# Altium schematic symbol library jlcpcb_2025_04_inductors_extended_0402.schlib: 1396 symbols (part 3 of 8)
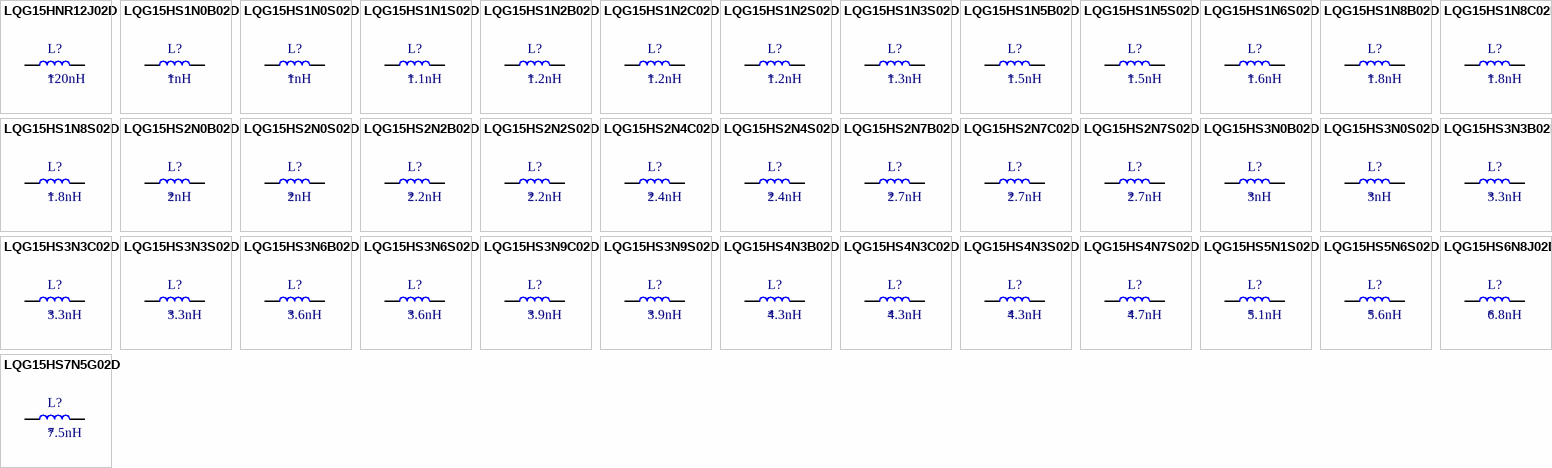
[diagram p36: symbols LQG15HNR12J02D to LQG15HS7N5G02D]

## LQG15HS2N0B02D
designator L?  Inductance: 2nH
Inductor, 2nH, 90mΩ, 900mA, SMD 0402; Manufacturer: Murata Electronics; Manufacturer Part Number: LQG15HS2N0B02D; Package Size: 0402; JLCPCB Basic Part: No; JLCPCB Part Number: C2986275; Supplier 1: LCSC; Category: Inductors; Supplier Part Number 1: C2986275; Rated Current: 900mA; DC Resistance: 90mΩ; RoHS: Yes; ComponentLink1Description: Datasheet; ComponentLink1URL: https://wmsc.lcsc.com/wmsc/upload/file/pdf/v2/lcsc/2206161801_Murata-Electronics-LQG15HS2N0B02D_C2986275.pdf; ComponentLink2Description: JLCPCB Part URL; ComponentLink2URL: https://jlcpcb.com/partdetail/C2986275; ComponentLink3Description: LCSC Part URL; ComponentLink3URL: https://lcsc.com/product-detail/Inductors-SMD_Murata-Electronics-Murata-Electronics-LQG15HS2N0B02D_C2986275.html
footprint IND-0402 (0402 (1005M) Inductor)
pins: 1, 2

## LQG15HS2N0S02D
designator L?  Inductance: 2nH
Inductor, 2nH, 90mΩ, 900mA, SMD 0402; Manufacturer: Murata Electronics; Manufacturer Part Number: LQG15HS2N0S02D; Self-Resonant Frequency: 6GHz; Q Factor: 8@100MHz; Package Size: 0402; JLCPCB Basic Part: No; JLCPCB Part Number: C18216; Supplier 1: LCSC; Category: Inductors; Supplier Part Number 1: C18216; Rated Current: 900mA; DC Resistance: 90mΩ; RoHS: Yes; ComponentLink1Description: Datasheet; ComponentLink1URL: https://wmsc.lcsc.com/wmsc/upload/file/pdf/v2/lcsc/2304140030_Murata-Electronics-LQG15HS2N0S02D_C18216.pdf; ComponentLink2Description: JLCPCB Part URL; ComponentLink2URL: https://jlcpcb.com/partdetail/C18216; ComponentLink3Description: LCSC Part URL; ComponentLink3URL: https://lcsc.com/product-detail/Inductors-SMD_Murata-Electronics-Murata-Electronics-LQG15HS2N0S02D_C18216.html
footprint IND-0402 (0402 (1005M) Inductor)
pins: 1, 2

## LQG15HS2N2B02D
designator L?  Inductance: 2.2nH
Inductor, 2.2nH, 90mΩ, 900mA, SMD 0402; Manufacturer: Murata Electronics; Manufacturer Part Number: LQG15HS2N2B02D; Self-Resonant Frequency: 6GHz; Q Factor: 8@100MHz; Package Size: 0402; JLCPCB Basic Part: No; JLCPCB Part Number: C162540; Supplier 1: LCSC; Category: Inductors; Supplier Part Number 1: C162540; Rated Current: 900mA; DC Resistance: 90mΩ; RoHS: Yes; ComponentLink1Description: Datasheet; ComponentLink1URL: https://wmsc.lcsc.com/wmsc/upload/file/pdf/v2/lcsc/2304140030_Murata-Electronics-LQG15HS2N2B02D_C162540.pdf; ComponentLink2Description: JLCPCB Part URL; ComponentLink2URL: https://jlcpcb.com/partdetail/C162540; ComponentLink3Description: LCSC Part URL; ComponentLink3URL: https://lcsc.com/product-detail/Inductors-SMD_Murata-Electronics-Murata-Electronics-LQG15HS2N2B02D_C162540.html
footprint IND-0402 (0402 (1005M) Inductor)
pins: 1, 2

## LQG15HS2N2S02D
designator L?  Inductance: 2.2nH
Inductor, 2.2nH, 90mΩ, 900mA, SMD 0402; Manufacturer: Murata Electronics; Manufacturer Part Number: LQG15HS2N2S02D; Self-Resonant Frequency: 6GHz; Q Factor: 8@100MHz; Package Size: 0402; JLCPCB Basic Part: No; JLCPCB Part Number: C86061; Supplier 1: LCSC; Category: Inductors; Supplier Part Number 1: C86061; Rated Current: 900mA; DC Resistance: 90mΩ; RoHS: Yes; ComponentLink1Description: Datasheet; ComponentLink1URL: https://wmsc.lcsc.com/wmsc/upload/file/pdf/v2/lcsc/2304140030_Murata-Electronics-LQG15HS2N2S02D_C86061.pdf; ComponentLink2Description: JLCPCB Part URL; ComponentLink2URL: https://jlcpcb.com/partdetail/C86061; ComponentLink3Description: LCSC Part URL; ComponentLink3URL: https://lcsc.com/product-detail/Inductors-SMD_Murata-Electronics-Murata-Electronics-LQG15HS2N2S02D_C86061.html
footprint IND-0402 (0402 (1005M) Inductor)
pins: 1, 2

## LQG15HS2N4C02D
designator L?  Inductance: 2.4nH
Inductor, 2.4nH, 110mΩ, 850mA, SMD 0402; Manufacturer: Murata Electronics; Manufacturer Part Number: LQG15HS2N4C02D; Self-Resonant Frequency: 6GHz; Q Factor: 8@100MHz; Package Size: 0402; JLCPCB Basic Part: No; JLCPCB Part Number: C1330457; Supplier 1: LCSC; Category: Inductors; Supplier Part Number 1: C1330457; Rated Current: 850mA; DC Resistance: 110mΩ; RoHS: Yes; ComponentLink1Description: Datasheet; ComponentLink1URL: https://wmsc.lcsc.com/wmsc/upload/file/pdf/v2/lcsc/2304140030_Murata-Electronics-LQG15HS2N4C02D_C1330457.pdf; ComponentLink2Description: JLCPCB Part URL; ComponentLink2URL: https://jlcpcb.com/partdetail/C1330457; ComponentLink3Description: LCSC Part URL; ComponentLink3URL: https://lcsc.com/product-detail/Inductors-SMD_Murata-Electronics-Murata-Electronics-LQG15HS2N4C02D_C1330457.html
footprint IND-0402 (0402 (1005M) Inductor)
pins: 1, 2

## LQG15HS2N4S02D
designator L?  Inductance: 2.4nH
Inductor, 2.4nH, 110mΩ, 850mA, SMD 0402; Manufacturer: Murata Electronics; Manufacturer Part Number: LQG15HS2N4S02D; Self-Resonant Frequency: 6GHz; Q Factor: 8@100MHz; Package Size: 0402; JLCPCB Basic Part: No; JLCPCB Part Number: C97997; Supplier 1: LCSC; Category: Inductors; Supplier Part Number 1: C97997; Rated Current: 850mA; DC Resistance: 110mΩ; RoHS: Yes; ComponentLink1Description: Datasheet; ComponentLink1URL: https://wmsc.lcsc.com/wmsc/upload/file/pdf/v2/lcsc/1811081514_Murata-Electronics-LQG15HS2N4S02D_C97997.pdf; ComponentLink2Description: JLCPCB Part URL; ComponentLink2URL: https://jlcpcb.com/partdetail/C97997; ComponentLink3Description: LCSC Part URL; ComponentLink3URL: https://lcsc.com/product-detail/Inductors-SMD_Murata-Electronics-Murata-Electronics-LQG15HS2N4S02D_C97997.html
footprint IND-0402 (0402 (1005M) Inductor)
pins: 1, 2

## LQG15HS2N7B02D
designator L?  Inductance: 2.7nH
Inductor, 2.7nH, 120mΩ, 800mA, SMD 0402; Manufacturer: Murata Electronics; Manufacturer Part Number: LQG15HS2N7B02D; Self-Resonant Frequency: 6GHz; Q Factor: 8@100MHz; Package Size: 0402; JLCPCB Basic Part: No; JLCPCB Part Number: C162541; Supplier 1: LCSC; Category: Inductors; Supplier Part Number 1: C162541; Rated Current: 800mA; DC Resistance: 120mΩ; RoHS: Yes; ComponentLink1Description: Datasheet; ComponentLink1URL: https://wmsc.lcsc.com/wmsc/upload/file/pdf/v2/lcsc/2304140030_Murata-Electronics-LQG15HS2N7B02D_C162541.pdf; ComponentLink2Description: JLCPCB Part URL; ComponentLink2URL: https://jlcpcb.com/partdetail/C162541; ComponentLink3Description: LCSC Part URL; ComponentLink3URL: https://lcsc.com/product-detail/Inductors-SMD_Murata-Electronics-Murata-Electronics-LQG15HS2N7B02D_C162541.html
footprint IND-0402 (0402 (1005M) Inductor)
pins: 1, 2

## LQG15HS2N7C02D
designator L?  Inductance: 2.7nH
Inductor, 2.7nH, 120mΩ, 800mA, SMD 0402; Manufacturer: Murata Electronics; Manufacturer Part Number: LQG15HS2N7C02D; Self-Resonant Frequency: 6GHz; Q Factor: 8@100MHz; Package Size: 0402; JLCPCB Basic Part: No; JLCPCB Part Number: C2043511; Supplier 1: LCSC; Category: Inductors; Supplier Part Number 1: C2043511; Rated Current: 800mA; DC Resistance: 120mΩ; RoHS: Yes; ComponentLink1Description: Datasheet; ComponentLink1URL: https://wmsc.lcsc.com/wmsc/upload/file/pdf/v2/lcsc/2304140030_Murata-Electronics-LQG15HS2N7C02D_C2043511.pdf; ComponentLink2Description: JLCPCB Part URL; ComponentLink2URL: https://jlcpcb.com/partdetail/C2043511; ComponentLink3Description: LCSC Part URL; ComponentLink3URL: https://lcsc.com/product-detail/Inductors-SMD_Murata-Electronics-Murata-Electronics-LQG15HS2N7C02D_C2043511.html
footprint IND-0402 (0402 (1005M) Inductor)
pins: 1, 2

## LQG15HS2N7S02D
designator L?  Inductance: 2.7nH
Inductor, 2.7nH, 120mΩ, 800mA, SMD 0402; Manufacturer: Murata Electronics; Manufacturer Part Number: LQG15HS2N7S02D; Self-Resonant Frequency: 6GHz; Q Factor: 8@100MHz; Package Size: 0402; JLCPCB Basic Part: No; JLCPCB Part Number: C77108; Supplier 1: LCSC; Category: Inductors; Supplier Part Number 1: C77108; Rated Current: 800mA; DC Resistance: 120mΩ; RoHS: Yes; ComponentLink1Description: Datasheet; ComponentLink1URL: https://wmsc.lcsc.com/wmsc/upload/file/pdf/v2/lcsc/2304140030_Murata-Electronics-LQG15HS2N7S02D_C77108.pdf; ComponentLink2Description: JLCPCB Part URL; ComponentLink2URL: https://jlcpcb.com/partdetail/C77108; ComponentLink3Description: LCSC Part URL; ComponentLink3URL: https://lcsc.com/product-detail/Inductors-SMD_Murata-Electronics-Murata-Electronics-LQG15HS2N7S02D_C77108.html
footprint IND-0402 (0402 (1005M) Inductor)
pins: 1, 2

## LQG15HS3N0B02D
designator L?  Inductance: 3nH
Inductor, 3nH, 125mΩ, 800mA, SMD 0402; Manufacturer: Murata Electronics; Manufacturer Part Number: LQG15HS3N0B02D; Package Size: 0402; JLCPCB Basic Part: No; JLCPCB Part Number: C3910378; Supplier 1: LCSC; Category: Inductors; Supplier Part Number 1: C3910378; Rated Current: 800mA; DC Resistance: 125mΩ; RoHS: Yes; ComponentLink1Description: Datasheet; ComponentLink1URL: https://wmsc.lcsc.com/wmsc/upload/file/pdf/v2/lcsc/2308111609_Murata-Electronics-LQG15HS3N0B02D_C3910378.pdf; ComponentLink2Description: JLCPCB Part URL; ComponentLink2URL: https://jlcpcb.com/partdetail/C3910378; ComponentLink3Description: LCSC Part URL; ComponentLink3URL: https://lcsc.com/product-detail/Inductors-SMD_Murata-Electronics-Murata-Electronics-LQG15HS3N0B02D_C3910378.html
footprint IND-0402 (0402 (1005M) Inductor)
pins: 1, 2

## LQG15HS3N0S02D
designator L?  Inductance: 3nH
Inductor, 3nH, 125mΩ, 800mA, SMD 0402; Manufacturer: Murata Electronics; Manufacturer Part Number: LQG15HS3N0S02D; Self-Resonant Frequency: 6GHz; Q Factor: 8@100MHz; Package Size: 0402; JLCPCB Basic Part: No; JLCPCB Part Number: C19898; Supplier 1: LCSC; Category: Inductors; Supplier Part Number 1: C19898; Rated Current: 800mA; DC Resistance: 125mΩ; RoHS: Yes; ComponentLink1Description: Datasheet; ComponentLink1URL: https://wmsc.lcsc.com/wmsc/upload/file/pdf/v2/lcsc/2304140030_Murata-Electronics-LQG15HS3N0S02D_C19898.pdf; ComponentLink2Description: JLCPCB Part URL; ComponentLink2URL: https://jlcpcb.com/partdetail/C19898; ComponentLink3Description: LCSC Part URL; ComponentLink3URL: https://lcsc.com/product-detail/Inductors-SMD_Murata-Electronics-Murata-Electronics-LQG15HS3N0S02D_C19898.html
footprint IND-0402 (0402 (1005M) Inductor)
pins: 1, 2

## LQG15HS3N3B02D
designator L?  Inductance: 3.3nH
Inductor, 3.3nH, 125mΩ, 800mA, SMD 0402; Manufacturer: Murata Electronics; Manufacturer Part Number: LQG15HS3N3B02D; Self-Resonant Frequency: 6GHz; Q Factor: 8@100MHz; Package Size: 0402; JLCPCB Basic Part: No; JLCPCB Part Number: C162542; Supplier 1: LCSC; Category: Inductors; Supplier Part Number 1: C162542; Rated Current: 800mA; DC Resistance: 125mΩ; RoHS: Yes; ComponentLink1Description: Datasheet; ComponentLink1URL: https://wmsc.lcsc.com/wmsc/upload/file/pdf/v2/lcsc/2304140030_Murata-Electronics-LQG15HS3N3B02D_C162542.pdf; ComponentLink2Description: JLCPCB Part URL; ComponentLink2URL: https://jlcpcb.com/partdetail/C162542; ComponentLink3Description: LCSC Part URL; ComponentLink3URL: https://lcsc.com/product-detail/Inductors-SMD_Murata-Electronics-Murata-Electronics-LQG15HS3N3B02D_C162542.html
footprint IND-0402 (0402 (1005M) Inductor)
pins: 1, 2

## LQG15HS3N3C02D
designator L?  Inductance: 3.3nH
Inductor, 3.3nH, 125mΩ, 800mA, SMD 0402; Manufacturer: Murata Electronics; Manufacturer Part Number: LQG15HS3N3C02D; Self-Resonant Frequency: 6GHz; Q Factor: 8@100MHz; Package Size: 0402; JLCPCB Basic Part: No; JLCPCB Part Number: C516799; Supplier 1: LCSC; Category: Inductors; Supplier Part Number 1: C516799; Rated Current: 800mA; DC Resistance: 125mΩ; RoHS: Yes; ComponentLink1Description: Datasheet; ComponentLink1URL: https://wmsc.lcsc.com/wmsc/upload/file/pdf/v2/lcsc/2304140030_Murata-Electronics-LQG15HS3N3C02D_C516799.pdf; ComponentLink2Description: JLCPCB Part URL; ComponentLink2URL: https://jlcpcb.com/partdetail/C516799; ComponentLink3Description: LCSC Part URL; ComponentLink3URL: https://lcsc.com/product-detail/Inductors-SMD_Murata-Electronics-Murata-Electronics-LQG15HS3N3C02D_C516799.html
footprint IND-0402 (0402 (1005M) Inductor)
pins: 1, 2

## LQG15HS3N3S02D
designator L?  Inductance: 3.3nH
Inductor, 3.3nH, 125mΩ, 800mA, SMD 0402; Manufacturer: Murata Electronics; Manufacturer Part Number: LQG15HS3N3S02D; Self-Resonant Frequency: 6GHz; Q Factor: 8@100MHz; Package Size: 0402; JLCPCB Basic Part: No; JLCPCB Part Number: C86064; Supplier 1: LCSC; Category: Inductors; Supplier Part Number 1: C86064; Rated Current: 800mA; DC Resistance: 125mΩ; RoHS: Yes; ComponentLink1Description: Datasheet; ComponentLink1URL: https://wmsc.lcsc.com/wmsc/upload/file/pdf/v2/lcsc/1811081614_Murata-Electronics-LQG15HS3N3S02D_C86064.pdf; ComponentLink2Description: JLCPCB Part URL; ComponentLink2URL: https://jlcpcb.com/partdetail/C86064; ComponentLink3Description: LCSC Part URL; ComponentLink3URL: https://lcsc.com/product-detail/Inductors-SMD_Murata-Electronics-Murata-Electronics-LQG15HS3N3S02D_C86064.html
footprint IND-0402 (0402 (1005M) Inductor)
pins: 1, 2

## LQG15HS3N6B02D
designator L?  Inductance: 3.6nH
Inductor, 3.6nH, 140mΩ, 750mA, SMD 0402; Manufacturer: Murata Electronics; Manufacturer Part Number: LQG15HS3N6B02D; Self-Resonant Frequency: 6GHz; Q Factor: 8@100MHz; Package Size: 0402; JLCPCB Basic Part: No; JLCPCB Part Number: C237532; Supplier 1: LCSC; Category: Inductors; Supplier Part Number 1: C237532; Rated Current: 750mA; DC Resistance: 140mΩ; RoHS: Yes; ComponentLink1Description: Datasheet; ComponentLink1URL: https://wmsc.lcsc.com/wmsc/upload/file/pdf/v2/lcsc/2304140030_Murata-Electronics-LQG15HS3N6B02D_C237532.pdf; ComponentLink2Description: JLCPCB Part URL; ComponentLink2URL: https://jlcpcb.com/partdetail/C237532; ComponentLink3Description: LCSC Part URL; ComponentLink3URL: https://lcsc.com/product-detail/Inductors-SMD_Murata-Electronics-Murata-Electronics-LQG15HS3N6B02D_C237532.html
footprint IND-0402 (0402 (1005M) Inductor)
pins: 1, 2

## LQG15HS3N6S02D
designator L?  Inductance: 3.6nH
Inductor, 3.6nH, 140mΩ, 750mA, SMD 0402; Manufacturer: Murata Electronics; Manufacturer Part Number: LQG15HS3N6S02D; Self-Resonant Frequency: 6GHz; Q Factor: 8@100MHz; Package Size: 0402; JLCPCB Basic Part: No; JLCPCB Part Number: C19216; Supplier 1: LCSC; Category: Inductors; Supplier Part Number 1: C19216; Rated Current: 750mA; DC Resistance: 140mΩ; RoHS: Yes; ComponentLink1Description: Datasheet; ComponentLink1URL: https://wmsc.lcsc.com/wmsc/upload/file/pdf/v2/lcsc/2304140030_Murata-Electronics-LQG15HS3N6S02D_C19216.pdf; ComponentLink2Description: JLCPCB Part URL; ComponentLink2URL: https://jlcpcb.com/partdetail/C19216; ComponentLink3Description: LCSC Part URL; ComponentLink3URL: https://lcsc.com/product-detail/Inductors-SMD_Murata-Electronics-Murata-Electronics-LQG15HS3N6S02D_C19216.html
footprint IND-0402 (0402 (1005M) Inductor)
pins: 1, 2

## LQG15HS3N9C02D
designator L?  Inductance: 3.9nH
Inductor, 3.9nH, 140mΩ, 750mA, SMD 0402; Manufacturer: Murata Electronics; Manufacturer Part Number: LQG15HS3N9C02D; Self-Resonant Frequency: 6GHz; Q Factor: 8@100MHz; Package Size: 0402; JLCPCB Basic Part: No; JLCPCB Part Number: C560064; Supplier 1: LCSC; Category: Inductors; Supplier Part Number 1: C560064; Rated Current: 750mA; DC Resistance: 140mΩ; RoHS: Yes; ComponentLink1Description: Datasheet; ComponentLink1URL: https://wmsc.lcsc.com/wmsc/upload/file/pdf/v2/lcsc/2304140030_Murata-Electronics-LQG15HS3N9C02D_C560064.pdf; ComponentLink2Description: JLCPCB Part URL; ComponentLink2URL: https://jlcpcb.com/partdetail/C560064; ComponentLink3Description: LCSC Part URL; ComponentLink3URL: https://lcsc.com/product-detail/Inductors-SMD_Murata-Electronics-Murata-Electronics-LQG15HS3N9C02D_C560064.html
footprint IND-0402 (0402 (1005M) Inductor)
pins: 1, 2

## LQG15HS3N9S02D
designator L?  Inductance: 3.9nH
Inductor, 3.9nH, 140mΩ, 750mA, SMD 0402; Manufacturer: Murata Electronics; Manufacturer Part Number: LQG15HS3N9S02D; Self-Resonant Frequency: 6GHz; Q Factor: 8@100MHz; Package Size: 0402; JLCPCB Basic Part: No; JLCPCB Part Number: C77109; Supplier 1: LCSC; Category: Inductors; Supplier Part Number 1: C77109; Rated Current: 750mA; DC Resistance: 140mΩ; RoHS: Yes; ComponentLink1Description: Datasheet; ComponentLink1URL: https://wmsc.lcsc.com/wmsc/upload/file/pdf/v2/lcsc/2304140030_Murata-Electronics-LQG15HS3N9S02D_C77109.pdf; ComponentLink2Description: JLCPCB Part URL; ComponentLink2URL: https://jlcpcb.com/partdetail/C77109; ComponentLink3Description: LCSC Part URL; ComponentLink3URL: https://lcsc.com/product-detail/Inductors-SMD_Murata-Electronics-Murata-Electronics-LQG15HS3N9S02D_C77109.html
footprint IND-0402 (0402 (1005M) Inductor)
pins: 1, 2

## LQG15HS4N3B02D
designator L?  Inductance: 4.3nH
Inductor, 4.3nH, 140mΩ, 750mA, SMD 0402; Manufacturer: Murata Electronics; Manufacturer Part Number: LQG15HS4N3B02D; Self-Resonant Frequency: 6GHz; Q Factor: 8@100MHz; Package Size: 0402; JLCPCB Basic Part: No; JLCPCB Part Number: C668382; Supplier 1: LCSC; Category: Inductors; Supplier Part Number 1: C668382; Rated Current: 750mA; DC Resistance: 140mΩ; RoHS: Yes; ComponentLink1Description: Datasheet; ComponentLink1URL: https://wmsc.lcsc.com/wmsc/upload/file/pdf/v2/lcsc/2304140030_Murata-Electronics-LQG15HS4N3B02D_C668382.pdf; ComponentLink2Description: JLCPCB Part URL; ComponentLink2URL: https://jlcpcb.com/partdetail/C668382; ComponentLink3Description: LCSC Part URL; ComponentLink3URL: https://lcsc.com/product-detail/Inductors-SMD_Murata-Electronics-Murata-Electronics-LQG15HS4N3B02D_C668382.html
footprint IND-0402 (0402 (1005M) Inductor)
pins: 1, 2

## LQG15HS4N3C02D
designator L?  Inductance: 4.3nH
Inductor, 4.3nH, 140mΩ, 750mA, SMD 0402; Manufacturer: Murata Electronics; Manufacturer Part Number: LQG15HS4N3C02D; Self-Resonant Frequency: 6GHz; Q Factor: 8@100MHz; Package Size: 0402; JLCPCB Basic Part: No; JLCPCB Part Number: C1330729; Supplier 1: LCSC; Category: Inductors; Supplier Part Number 1: C1330729; Rated Current: 750mA; DC Resistance: 140mΩ; RoHS: Yes; ComponentLink1Description: Datasheet; ComponentLink1URL: https://wmsc.lcsc.com/wmsc/upload/file/pdf/v2/lcsc/2304140030_Murata-Electronics-LQG15HS4N3C02D_C1330729.pdf; ComponentLink2Description: JLCPCB Part URL; ComponentLink2URL: https://jlcpcb.com/partdetail/C1330729; ComponentLink3Description: LCSC Part URL; ComponentLink3URL: https://lcsc.com/product-detail/Inductors-SMD_Murata-Electronics-Murata-Electronics-LQG15HS4N3C02D_C1330729.html
footprint IND-0402 (0402 (1005M) Inductor)
pins: 1, 2

## LQG15HS4N3S02D
designator L?  Inductance: 4.3nH
Inductor, 4.3nH, 140mΩ, 750mA, SMD 0402; Manufacturer: Murata Electronics; Manufacturer Part Number: LQG15HS4N3S02D; Self-Resonant Frequency: 6GHz; Q Factor: 8@100MHz; Package Size: 0402; JLCPCB Basic Part: No; JLCPCB Part Number: C97999; Supplier 1: LCSC; Category: Inductors; Supplier Part Number 1: C97999; Rated Current: 750mA; DC Resistance: 140mΩ; RoHS: Yes; ComponentLink1Description: Datasheet; ComponentLink1URL: https://wmsc.lcsc.com/wmsc/upload/file/pdf/v2/lcsc/2304140030_Murata-Electronics-LQG15HS4N3S02D_C97999.pdf; ComponentLink2Description: JLCPCB Part URL; ComponentLink2URL: https://jlcpcb.com/partdetail/C97999; ComponentLink3Description: LCSC Part URL; ComponentLink3URL: https://lcsc.com/product-detail/Inductors-SMD_Murata-Electronics-Murata-Electronics-LQG15HS4N3S02D_C97999.html
footprint IND-0402 (0402 (1005M) Inductor)
pins: 1, 2

## LQG15HS4N7S02D
designator L?  Inductance: 4.7nH
Inductor, 4.7nH, 160mΩ, 700mA, SMD 0402; Manufacturer: Murata Electronics; Manufacturer Part Number: LQG15HS4N7S02D; Self-Resonant Frequency: 6GHz; Q Factor: 8@100MHz; Package Size: 0402; JLCPCB Basic Part: No; JLCPCB Part Number: C86065; Supplier 1: LCSC; Category: Inductors; Supplier Part Number 1: C86065; Rated Current: 700mA; DC Resistance: 160mΩ; RoHS: Yes; ComponentLink1Description: Datasheet; ComponentLink1URL: https://wmsc.lcsc.com/wmsc/upload/file/pdf/v2/lcsc/1811081614_Murata-Electronics-LQG15HS4N7S02D_C86065.pdf; ComponentLink2Description: JLCPCB Part URL; ComponentLink2URL: https://jlcpcb.com/partdetail/C86065; ComponentLink3Description: LCSC Part URL; ComponentLink3URL: https://lcsc.com/product-detail/Inductors-SMD_Murata-Electronics-Murata-Electronics-LQG15HS4N7S02D_C86065.html
footprint IND-0402 (0402 (1005M) Inductor)
pins: 1, 2

## LQG15HS5N1S02D
designator L?  Inductance: 5.1nH
Inductor, 5.1nH, 180mΩ, 650mA, SMD 0402; Manufacturer: Murata Electronics; Manufacturer Part Number: LQG15HS5N1S02D; Self-Resonant Frequency: 5.3GHz; Q Factor: 8@100MHz; Package Size: 0402; JLCPCB Basic Part: No; JLCPCB Part Number: C86066; Supplier 1: LCSC; Category: Inductors; Supplier Part Number 1: C86066; Rated Current: 650mA; DC Resistance: 180mΩ; RoHS: Yes; ComponentLink1Description: Datasheet; ComponentLink1URL: https://wmsc.lcsc.com/wmsc/upload/file/pdf/v2/lcsc/1811081616_Murata-Electronics-LQG15HS5N1S02D_C86066.pdf; ComponentLink2Description: JLCPCB Part URL; ComponentLink2URL: https://jlcpcb.com/partdetail/C86066; ComponentLink3Description: LCSC Part URL; ComponentLink3URL: https://lcsc.com/product-detail/Inductors-SMD_Murata-Electronics-Murata-Electronics-LQG15HS5N1S02D_C86066.html
footprint IND-0402 (0402 (1005M) Inductor)
pins: 1, 2

## LQG15HS5N6S02D
designator L?  Inductance: 5.6nH
Inductor, 5.6nH, 180mΩ, 650mA, SMD 0402; Manufacturer: Murata Electronics; Manufacturer Part Number: LQG15HS5N6S02D; Self-Resonant Frequency: 4.5GHz; Q Factor: 8@100MHz; Package Size: 0402; JLCPCB Basic Part: No; JLCPCB Part Number: C85670; Supplier 1: LCSC; Category: Inductors; Supplier Part Number 1: C85670; Rated Current: 650mA; DC Resistance: 180mΩ; RoHS: Yes; ComponentLink1Description: Datasheet; ComponentLink1URL: https://wmsc.lcsc.com/wmsc/upload/file/pdf/v2/lcsc/2304140030_Murata-Electronics-LQG15HS5N6S02D_C85670.pdf; ComponentLink2Description: JLCPCB Part URL; ComponentLink2URL: https://jlcpcb.com/partdetail/C85670; ComponentLink3Description: LCSC Part URL; ComponentLink3URL: https://lcsc.com/product-detail/Inductors-SMD_Murata-Electronics-Murata-Electronics-LQG15HS5N6S02D_C85670.html
footprint IND-0402 (0402 (1005M) Inductor)
pins: 1, 2

## LQG15HS6N8J02D
designator L?  Inductance: 6.8nH
Inductor, 6.8nH, ±5%, 220mΩ, 600mA, SMD 0402; Manufacturer: Murata Electronics; Manufacturer Part Number: LQG15HS6N8J02D; Self-Resonant Frequency: 4.5GHz; Q Factor: 8@100MHz; Package Size: 0402; JLCPCB Basic Part: No; JLCPCB Part Number: C77110; Supplier 1: LCSC; Category: Inductors; Supplier Part Number 1: C77110; Tolerance: ±5%; Rated Current: 600mA; DC Resistance: 220mΩ; RoHS: Yes; ComponentLink1Description: Datasheet; ComponentLink1URL: https://wmsc.lcsc.com/wmsc/upload/file/pdf/v2/lcsc/2304140030_Murata-Electronics-LQG15HS6N8J02D_C77110.pdf; ComponentLink2Description: JLCPCB Part URL; ComponentLink2URL: https://jlcpcb.com/partdetail/C77110; ComponentLink3Description: LCSC Part URL; ComponentLink3URL: https://lcsc.com/product-detail/Inductors-SMD_Murata-Electronics-Murata-Electronics-LQG15HS6N8J02D_C77110.html
footprint IND-0402 (0402 (1005M) Inductor)
pins: 1, 2

## LQG15HS7N5G02D
designator L?  Inductance: 7.5nH
Inductor, 7.5nH, ±2%, 240mΩ, 550mA, SMD 0402; Manufacturer: Murata Electronics; Manufacturer Part Number: LQG15HS7N5G02D; Package Size: 0402; JLCPCB Basic Part: No; JLCPCB Part Number: C3911343; Supplier 1: LCSC; Category: Inductors; Supplier Part Number 1: C3911343; Tolerance: ±2%; Rated Current: 550mA; DC Resistance: 240mΩ; RoHS: Yes; ComponentLink1Description: Datasheet; ComponentLink1URL: https://wmsc.lcsc.com/wmsc/upload/file/pdf/v2/lcsc/2308111610_Murata-Electronics-LQG15HS7N5G02D_C3911343.pdf; ComponentLink2Description: JLCPCB Part URL; ComponentLink2URL: https://jlcpcb.com/partdetail/C3911343; ComponentLink3Description: LCSC Part URL; ComponentLink3URL: https://lcsc.com/product-detail/Inductors-SMD_Murata-Electronics-Murata-Electronics-LQG15HS7N5G02D_C3911343.html
footprint IND-0402 (0402 (1005M) Inductor)
pins: 1, 2

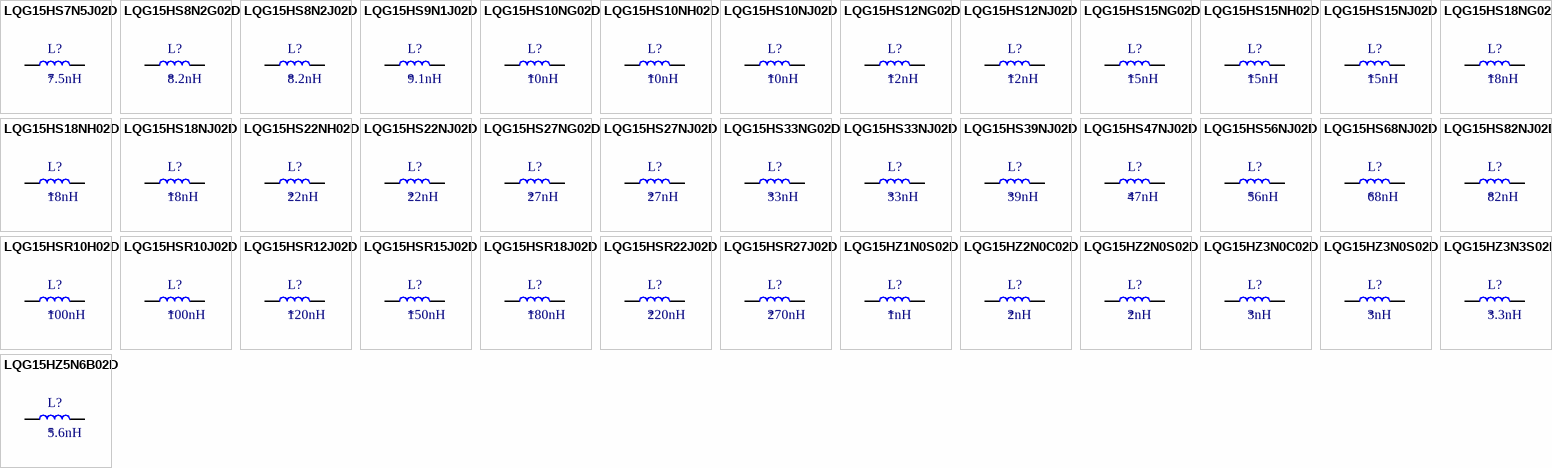
[diagram p10: symbols LQG15HS7N5J02D to LQG15HZ5N6B02D]

## LQG15HS7N5J02D
designator L?  Inductance: 7.5nH
Inductor, 7.5nH, ±5%, 240mΩ, 550mA, SMD 0402; Manufacturer: Murata Electronics; Manufacturer Part Number: LQG15HS7N5J02D; Self-Resonant Frequency: 4.2GHz; Q Factor: 8@100MHz; Package Size: 0402; JLCPCB Basic Part: No; JLCPCB Part Number: C98001; Supplier 1: LCSC; Category: Inductors; Supplier Part Number 1: C98001; Tolerance: ±5%; Rated Current: 550mA; DC Resistance: 240mΩ; RoHS: Yes; ComponentLink1Description: Datasheet; ComponentLink1URL: https://wmsc.lcsc.com/wmsc/upload/file/pdf/v2/lcsc/1811081532_Murata-Electronics-LQG15HS7N5J02D_C98001.pdf; ComponentLink2Description: JLCPCB Part URL; ComponentLink2URL: https://jlcpcb.com/partdetail/C98001; ComponentLink3Description: LCSC Part URL; ComponentLink3URL: https://lcsc.com/product-detail/Inductors-SMD_Murata-Electronics-Murata-Electronics-LQG15HS7N5J02D_C98001.html
footprint IND-0402 (0402 (1005M) Inductor)
pins: 1, 2

## LQG15HS8N2G02D
designator L?  Inductance: 8.2nH
Inductor, 8.2nH, ±2%, 240mΩ, 550mA, SMD 0402; Manufacturer: Murata Electronics; Manufacturer Part Number: LQG15HS8N2G02D; Package Size: 0402; JLCPCB Basic Part: No; JLCPCB Part Number: C3910635; Supplier 1: LCSC; Category: Inductors; Supplier Part Number 1: C3910635; Tolerance: ±2%; Rated Current: 550mA; DC Resistance: 240mΩ; RoHS: Yes; ComponentLink1Description: Datasheet; ComponentLink1URL: https://wmsc.lcsc.com/wmsc/upload/file/pdf/v2/lcsc/2308111609_Murata-Electronics-LQG15HS8N2G02D_C3910635.pdf; ComponentLink2Description: JLCPCB Part URL; ComponentLink2URL: https://jlcpcb.com/partdetail/C3910635; ComponentLink3Description: LCSC Part URL; ComponentLink3URL: https://lcsc.com/product-detail/Inductors-SMD_Murata-Electronics-Murata-Electronics-LQG15HS8N2G02D_C3910635.html
footprint IND-0402 (0402 (1005M) Inductor)
pins: 1, 2

## LQG15HS8N2J02D
designator L?  Inductance: 8.2nH
Inductor, 8.2nH, ±5%, 240mΩ, 550mA, SMD 0402; Manufacturer: Murata Electronics; Manufacturer Part Number: LQG15HS8N2J02D; Self-Resonant Frequency: 3.7GHz; Q Factor: 8@100MHz; Package Size: 0402; JLCPCB Basic Part: No; JLCPCB Part Number: C98003; Supplier 1: LCSC; Category: Inductors; Supplier Part Number 1: C98003; Tolerance: ±5%; Rated Current: 550mA; DC Resistance: 240mΩ; RoHS: Yes; ComponentLink1Description: Datasheet; ComponentLink1URL: https://wmsc.lcsc.com/wmsc/upload/file/pdf/v2/lcsc/1811081611_Murata-Electronics-LQG15HS8N2J02D_C98003.pdf; ComponentLink2Description: JLCPCB Part URL; ComponentLink2URL: https://jlcpcb.com/partdetail/C98003; ComponentLink3Description: LCSC Part URL; ComponentLink3URL: https://lcsc.com/product-detail/Inductors-SMD_Murata-Electronics-Murata-Electronics-LQG15HS8N2J02D_C98003.html
footprint IND-0402 (0402 (1005M) Inductor)
pins: 1, 2

## LQG15HS9N1J02D
designator L?  Inductance: 9.1nH
Inductor, 9.1nH, ±5%, 260mΩ, 500mA, SMD 0402; Manufacturer: Murata Electronics; Manufacturer Part Number: LQG15HS9N1J02D; Self-Resonant Frequency: 3.4GHz; Q Factor: 8@100MHz; Package Size: 0402; JLCPCB Basic Part: No; JLCPCB Part Number: C162547; Supplier 1: LCSC; Category: Inductors; Supplier Part Number 1: C162547; Tolerance: ±5%; Rated Current: 500mA; DC Resistance: 260mΩ; RoHS: Yes; ComponentLink1Description: Datasheet; ComponentLink1URL: https://wmsc.lcsc.com/wmsc/upload/file/pdf/v2/lcsc/2304140030_Murata-Electronics-LQG15HS9N1J02D_C162547.pdf; ComponentLink2Description: JLCPCB Part URL; ComponentLink2URL: https://jlcpcb.com/partdetail/C162547; ComponentLink3Description: LCSC Part URL; ComponentLink3URL: https://lcsc.com/product-detail/Inductors-SMD_Murata-Electronics-Murata-Electronics-LQG15HS9N1J02D_C162547.html
footprint IND-0402 (0402 (1005M) Inductor)
pins: 1, 2

## LQG15HS10NG02D
designator L?  Inductance: 10nH
Inductor, 10nH, ±2%, 260mΩ, 500mA, SMD 0402; Manufacturer: Murata Electronics; Manufacturer Part Number: LQG15HS10NG02D; Self-Resonant Frequency: 3.4GHz; Q Factor: 8@100MHz; Package Size: 0402; JLCPCB Basic Part: No; JLCPCB Part Number: C464435; Supplier 1: LCSC; Category: Inductors; Supplier Part Number 1: C464435; Tolerance: ±2%; Rated Current: 500mA; DC Resistance: 260mΩ; RoHS: Yes; ComponentLink1Description: Datasheet; ComponentLink1URL: https://wmsc.lcsc.com/wmsc/upload/file/pdf/v2/lcsc/1912111437_Murata-Electronics-LQG15HS10NG02D_C464435.pdf; ComponentLink2Description: JLCPCB Part URL; ComponentLink2URL: https://jlcpcb.com/partdetail/C464435; ComponentLink3Description: LCSC Part URL; ComponentLink3URL: https://lcsc.com/product-detail/Inductors-SMD_Murata-Electronics-Murata-Electronics-LQG15HS10NG02D_C464435.html
footprint IND-0402 (0402 (1005M) Inductor)
pins: 1, 2

## LQG15HS10NH02D
designator L?  Inductance: 10nH
Inductor, 10nH, ±3%, 260mΩ, 500mA, SMD 0402; Manufacturer: Murata Electronics; Manufacturer Part Number: LQG15HS10NH02D; Self-Resonant Frequency: 3.4GHz; Q Factor: 8@100MHz; Package Size: 0402; JLCPCB Basic Part: No; JLCPCB Part Number: C576525; Supplier 1: LCSC; Category: Inductors; Supplier Part Number 1: C576525; Tolerance: ±3%; Rated Current: 500mA; DC Resistance: 260mΩ; RoHS: Yes; ComponentLink1Description: Datasheet; ComponentLink1URL: https://wmsc.lcsc.com/wmsc/upload/file/pdf/v2/lcsc/2105241311_Murata-Electronics-LQG15HS10NH02D_C576525.pdf; ComponentLink2Description: JLCPCB Part URL; ComponentLink2URL: https://jlcpcb.com/partdetail/C576525; ComponentLink3Description: LCSC Part URL; ComponentLink3URL: https://lcsc.com/product-detail/Inductors-SMD_Murata-Electronics-Murata-Electronics-LQG15HS10NH02D_C576525.html
footprint IND-0402 (0402 (1005M) Inductor)
pins: 1, 2

## LQG15HS10NJ02D
designator L?  Inductance: 10nH
Inductor, 10nH, ±5%, 260mΩ, 500mA, SMD 0402; Manufacturer: Murata Electronics; Manufacturer Part Number: LQG15HS10NJ02D; Self-Resonant Frequency: 3.4GHz; Q Factor: 8@100MHz; Package Size: 0402; JLCPCB Basic Part: No; JLCPCB Part Number: C77103; Supplier 1: LCSC; Category: Inductors; Supplier Part Number 1: C77103; Tolerance: ±5%; Rated Current: 500mA; DC Resistance: 260mΩ; RoHS: Yes; ComponentLink1Description: Datasheet; ComponentLink1URL: https://wmsc.lcsc.com/wmsc/upload/file/pdf/v2/lcsc/2304140030_Murata-Electronics-LQG15HS10NJ02D_C77103.pdf; ComponentLink2Description: JLCPCB Part URL; ComponentLink2URL: https://jlcpcb.com/partdetail/C77103; ComponentLink3Description: LCSC Part URL; ComponentLink3URL: https://lcsc.com/product-detail/Inductors-SMD_Murata-Electronics-Murata-Electronics-LQG15HS10NJ02D_C77103.html
footprint IND-0402 (0402 (1005M) Inductor)
pins: 1, 2

## LQG15HS12NG02D
designator L?  Inductance: 12nH
Inductor, 12nH, ±2%, 280mΩ, SMD 0402; Manufacturer: Murata Electronics; Manufacturer Part Number: LQG15HS12NG02D; Self-Resonant Frequency: 3GHz; Q Factor: 8@100MHz; Package Size: 0402; JLCPCB Basic Part: No; JLCPCB Part Number: C907987; Supplier 1: LCSC; Category: Inductors; Supplier Part Number 1: C907987; Tolerance: ±2%; DC Resistance: 280mΩ; RoHS: Yes; ComponentLink1Description: Datasheet; ComponentLink1URL: https://wmsc.lcsc.com/wmsc/upload/file/pdf/v2/lcsc/2201242100_Murata-Electronics-LQG15HS12NG02D_C907987.pdf; ComponentLink2Description: JLCPCB Part URL; ComponentLink2URL: https://jlcpcb.com/partdetail/C907987; ComponentLink3Description: LCSC Part URL; ComponentLink3URL: https://lcsc.com/product-detail/Inductors-SMD_Murata-Electronics-Murata-Electronics-LQG15HS12NG02D_C907987.html
footprint IND-0402 (0402 (1005M) Inductor)
pins: 1, 2

## LQG15HS12NJ02D
designator L?  Inductance: 12nH
Inductor, 12nH, ±5%, 280mΩ, 500mA, SMD 0402; Manufacturer: Murata Electronics; Manufacturer Part Number: LQG15HS12NJ02D; Self-Resonant Frequency: 3GHz; Q Factor: 8@100MHz; Package Size: 0402; JLCPCB Basic Part: No; JLCPCB Part Number: C77104; Supplier 1: LCSC; Category: Inductors; Supplier Part Number 1: C77104; Tolerance: ±5%; Rated Current: 500mA; DC Resistance: 280mΩ; RoHS: Yes; ComponentLink1Description: Datasheet; ComponentLink1URL: https://wmsc.lcsc.com/wmsc/upload/file/pdf/v2/lcsc/2304140030_Murata-Electronics-LQG15HS12NJ02D_C77104.pdf; ComponentLink2Description: JLCPCB Part URL; ComponentLink2URL: https://jlcpcb.com/partdetail/C77104; ComponentLink3Description: LCSC Part URL; ComponentLink3URL: https://lcsc.com/product-detail/Inductors-SMD_Murata-Electronics-Murata-Electronics-LQG15HS12NJ02D_C77104.html
footprint IND-0402 (0402 (1005M) Inductor)
pins: 1, 2

## LQG15HS15NG02D
designator L?  Inductance: 15nH
Inductor, 15nH, ±2%, 320mΩ, 450mA, SMD 0402; Manufacturer: Murata Electronics; Manufacturer Part Number: LQG15HS15NG02D; Self-Resonant Frequency: 2.5GHz; Q Factor: 8@100MHz; Package Size: 0402; JLCPCB Basic Part: No; JLCPCB Part Number: C576527; Supplier 1: LCSC; Category: Inductors; Supplier Part Number 1: C576527; Tolerance: ±2%; Rated Current: 450mA; DC Resistance: 320mΩ; RoHS: Yes; ComponentLink1Description: Datasheet; ComponentLink1URL: https://wmsc.lcsc.com/wmsc/upload/file/pdf/v2/lcsc/2308111510_Murata-Electronics-LQG15HS15NG02D_C576527.pdf; ComponentLink2Description: JLCPCB Part URL; ComponentLink2URL: https://jlcpcb.com/partdetail/C576527; ComponentLink3Description: LCSC Part URL; ComponentLink3URL: https://lcsc.com/product-detail/Inductors-SMD_Murata-Electronics-Murata-Electronics-LQG15HS15NG02D_C576527.html
footprint IND-0402 (0402 (1005M) Inductor)
pins: 1, 2

## LQG15HS15NH02D
designator L?  Inductance: 15nH
Inductor, 15nH, ±3%, 320mΩ, 450mA, SMD 0402; Manufacturer: Murata Electronics; Manufacturer Part Number: LQG15HS15NH02D; Self-Resonant Frequency: 2.5GHz; Q Factor: 8@100MHz; Package Size: 0402; JLCPCB Basic Part: No; JLCPCB Part Number: C521066; Supplier 1: LCSC; Category: Inductors; Supplier Part Number 1: C521066; Tolerance: ±3%; Rated Current: 450mA; DC Resistance: 320mΩ; RoHS: Yes; ComponentLink1Description: Datasheet; ComponentLink1URL: https://wmsc.lcsc.com/wmsc/upload/file/pdf/v2/lcsc/2304140030_Murata-Electronics-LQG15HS15NH02D_C521066.pdf; ComponentLink2Description: JLCPCB Part URL; ComponentLink2URL: https://jlcpcb.com/partdetail/C521066; ComponentLink3Description: LCSC Part URL; ComponentLink3URL: https://lcsc.com/product-detail/Inductors-SMD_Murata-Electronics-Murata-Electronics-LQG15HS15NH02D_C521066.html
footprint IND-0402 (0402 (1005M) Inductor)
pins: 1, 2

## LQG15HS15NJ02D
designator L?  Inductance: 15nH
Inductor, 15nH, ±5%, 320mΩ, 450mA, SMD 0402; Manufacturer: Murata Electronics; Manufacturer Part Number: LQG15HS15NJ02D; Self-Resonant Frequency: 2.5GHz; Q Factor: 8@100MHz; Package Size: 0402; JLCPCB Basic Part: No; JLCPCB Part Number: C86059; Supplier 1: LCSC; Category: Inductors; Supplier Part Number 1: C86059; Tolerance: ±5%; Rated Current: 450mA; DC Resistance: 320mΩ; RoHS: Yes; ComponentLink1Description: Datasheet; ComponentLink1URL: https://wmsc.lcsc.com/wmsc/upload/file/pdf/v2/lcsc/1811081610_Murata-Electronics-LQG15HS15NJ02D_C86059.pdf; ComponentLink2Description: JLCPCB Part URL; ComponentLink2URL: https://jlcpcb.com/partdetail/C86059; ComponentLink3Description: LCSC Part URL; ComponentLink3URL: https://lcsc.com/product-detail/Inductors-SMD_Murata-Electronics-Murata-Electronics-LQG15HS15NJ02D_C86059.html
footprint IND-0402 (0402 (1005M) Inductor)
pins: 1, 2

## LQG15HS18NG02D
designator L?  Inductance: 18nH
Inductor, 18nH, ±2%, 360mΩ, 400mA, SMD 0402; Manufacturer: Murata Electronics; Manufacturer Part Number: LQG15HS18NG02D; Self-Resonant Frequency: 2.2GHz; Q Factor: 8@100MHz; Package Size: 0402; JLCPCB Basic Part: No; JLCPCB Part Number: C668381; Supplier 1: LCSC; Category: Inductors; Supplier Part Number 1: C668381; Tolerance: ±2%; Rated Current: 400mA; DC Resistance: 360mΩ; RoHS: Yes; ComponentLink1Description: Datasheet; ComponentLink1URL: https://wmsc.lcsc.com/wmsc/upload/file/pdf/v2/lcsc/2105241313_Murata-Electronics-LQG15HS18NG02D_C668381.pdf; ComponentLink2Description: JLCPCB Part URL; ComponentLink2URL: https://jlcpcb.com/partdetail/C668381; ComponentLink3Description: LCSC Part URL; ComponentLink3URL: https://lcsc.com/product-detail/Inductors-SMD_Murata-Electronics-Murata-Electronics-LQG15HS18NG02D_C668381.html
footprint IND-0402 (0402 (1005M) Inductor)
pins: 1, 2

## LQG15HS18NH02D
designator L?  Inductance: 18nH
Inductor, 18nH, ±3%, 360mΩ, 400mA, SMD 0402; Manufacturer: Murata Electronics; Manufacturer Part Number: LQG15HS18NH02D; Self-Resonant Frequency: 2.2GHz; Q Factor: 8@100MHz; Package Size: 0402; JLCPCB Basic Part: No; JLCPCB Part Number: C2043585; Supplier 1: LCSC; Category: Inductors; Supplier Part Number 1: C2043585; Tolerance: ±3%; Rated Current: 400mA; DC Resistance: 360mΩ; RoHS: Yes; ComponentLink1Description: Datasheet; ComponentLink1URL: https://wmsc.lcsc.com/wmsc/upload/file/pdf/v2/lcsc/2304140030_Murata-Electronics-LQG15HS18NH02D_C2043585.pdf; ComponentLink2Description: JLCPCB Part URL; ComponentLink2URL: https://jlcpcb.com/partdetail/C2043585; ComponentLink3Description: LCSC Part URL; ComponentLink3URL: https://lcsc.com/product-detail/Inductors-SMD_Murata-Electronics-Murata-Electronics-LQG15HS18NH02D_C2043585.html
footprint IND-0402 (0402 (1005M) Inductor)
pins: 1, 2

## LQG15HS18NJ02D
designator L?  Inductance: 18nH
Inductor, 18nH, ±5%, 360mΩ, 400mA, SMD 0402; Manufacturer: Murata Electronics; Manufacturer Part Number: LQG15HS18NJ02D; Self-Resonant Frequency: 2.2GHz; Q Factor: 8@100MHz; Package Size: 0402; JLCPCB Basic Part: No; JLCPCB Part Number: C86060; Supplier 1: LCSC; Category: Inductors; Supplier Part Number 1: C86060; Tolerance: ±5%; Rated Current: 400mA; DC Resistance: 360mΩ; RoHS: Yes; ComponentLink1Description: Datasheet; ComponentLink1URL: https://wmsc.lcsc.com/wmsc/upload/file/pdf/v2/lcsc/2304140030_Murata-Electronics-LQG15HS18NJ02D_C86060.pdf; ComponentLink2Description: JLCPCB Part URL; ComponentLink2URL: https://jlcpcb.com/partdetail/C86060; ComponentLink3Description: LCSC Part URL; ComponentLink3URL: https://lcsc.com/product-detail/Inductors-SMD_Murata-Electronics-Murata-Electronics-LQG15HS18NJ02D_C86060.html
footprint IND-0402 (0402 (1005M) Inductor)
pins: 1, 2

## LQG15HS22NH02D
designator L?  Inductance: 22nH
Inductor, 22nH, ±3%, 420mΩ, 350mA, SMD 0402; Manufacturer: Murata Electronics; Manufacturer Part Number: LQG15HS22NH02D; Self-Resonant Frequency: 1.9GHz; Q Factor: 8@100MHz; Package Size: 0402; JLCPCB Basic Part: No; JLCPCB Part Number: C2041459; Supplier 1: LCSC; Category: Inductors; Supplier Part Number 1: C2041459; Tolerance: ±3%; Rated Current: 350mA; DC Resistance: 420mΩ; RoHS: Yes; ComponentLink1Description: Datasheet; ComponentLink1URL: https://wmsc.lcsc.com/wmsc/upload/file/pdf/v2/lcsc/2304140030_Murata-Electronics-LQG15HS22NH02D_C2041459.pdf; ComponentLink2Description: JLCPCB Part URL; ComponentLink2URL: https://jlcpcb.com/partdetail/C2041459; ComponentLink3Description: LCSC Part URL; ComponentLink3URL: https://lcsc.com/product-detail/Inductors-SMD_Murata-Electronics-Murata-Electronics-LQG15HS22NH02D_C2041459.html
footprint IND-0402 (0402 (1005M) Inductor)
pins: 1, 2

## LQG15HS22NJ02D
designator L?  Inductance: 22nH
Inductor, 22nH, ±5%, 420mΩ, 350mA, SMD 0402; Manufacturer: Murata Electronics; Manufacturer Part Number: LQG15HS22NJ02D; Self-Resonant Frequency: 1.9GHz; Q Factor: 8@100MHz; Package Size: 0402; JLCPCB Basic Part: No; JLCPCB Part Number: C12670; Supplier 1: LCSC; Category: Inductors; Supplier Part Number 1: C12670; Tolerance: ±5%; Rated Current: 350mA; DC Resistance: 420mΩ; RoHS: Yes; ComponentLink1Description: Datasheet; ComponentLink1URL: https://wmsc.lcsc.com/wmsc/upload/file/pdf/v2/lcsc/2304140030_Murata-Electronics-LQG15HS22NJ02D_C12670.pdf; ComponentLink2Description: JLCPCB Part URL; ComponentLink2URL: https://jlcpcb.com/partdetail/C12670; ComponentLink3Description: LCSC Part URL; ComponentLink3URL: https://lcsc.com/product-detail/Inductors-SMD_Murata-Electronics-Murata-Electronics-LQG15HS22NJ02D_C12670.html
footprint IND-0402 (0402 (1005M) Inductor)
pins: 1, 2

## LQG15HS27NG02D
designator L?  Inductance: 27nH
Inductor, 27nH, ±2%, 460mΩ, 350mA, SMD 0402; Manufacturer: Murata Electronics; Manufacturer Part Number: LQG15HS27NG02D; Package Size: 0402; JLCPCB Basic Part: No; JLCPCB Part Number: C3910610; Supplier 1: LCSC; Category: Inductors; Supplier Part Number 1: C3910610; Tolerance: ±2%; Rated Current: 350mA; DC Resistance: 460mΩ; RoHS: Yes; ComponentLink1Description: Datasheet; ComponentLink1URL: https://wmsc.lcsc.com/wmsc/upload/file/pdf/v2/lcsc/2308111609_Murata-Electronics-LQG15HS27NG02D_C3910610.pdf; ComponentLink2Description: JLCPCB Part URL; ComponentLink2URL: https://jlcpcb.com/partdetail/C3910610; ComponentLink3Description: LCSC Part URL; ComponentLink3URL: https://lcsc.com/product-detail/Inductors-SMD_Murata-Electronics-Murata-Electronics-LQG15HS27NG02D_C3910610.html
footprint IND-0402 (0402 (1005M) Inductor)
pins: 1, 2
